# Altium footprint library MyLibrarySum.PcbLib: 208 footprints (part 11 of 13)
Each footprint in its own frame and in the unit in brackets; x right, y up, seen from the top. Pads: shape width x height; smd on the part's side, far side on the other; paste and mask are expansions set on the pad; w line width, h text height; cw(c..) or ccw(c..) is an arc to the next point about the centre after c.
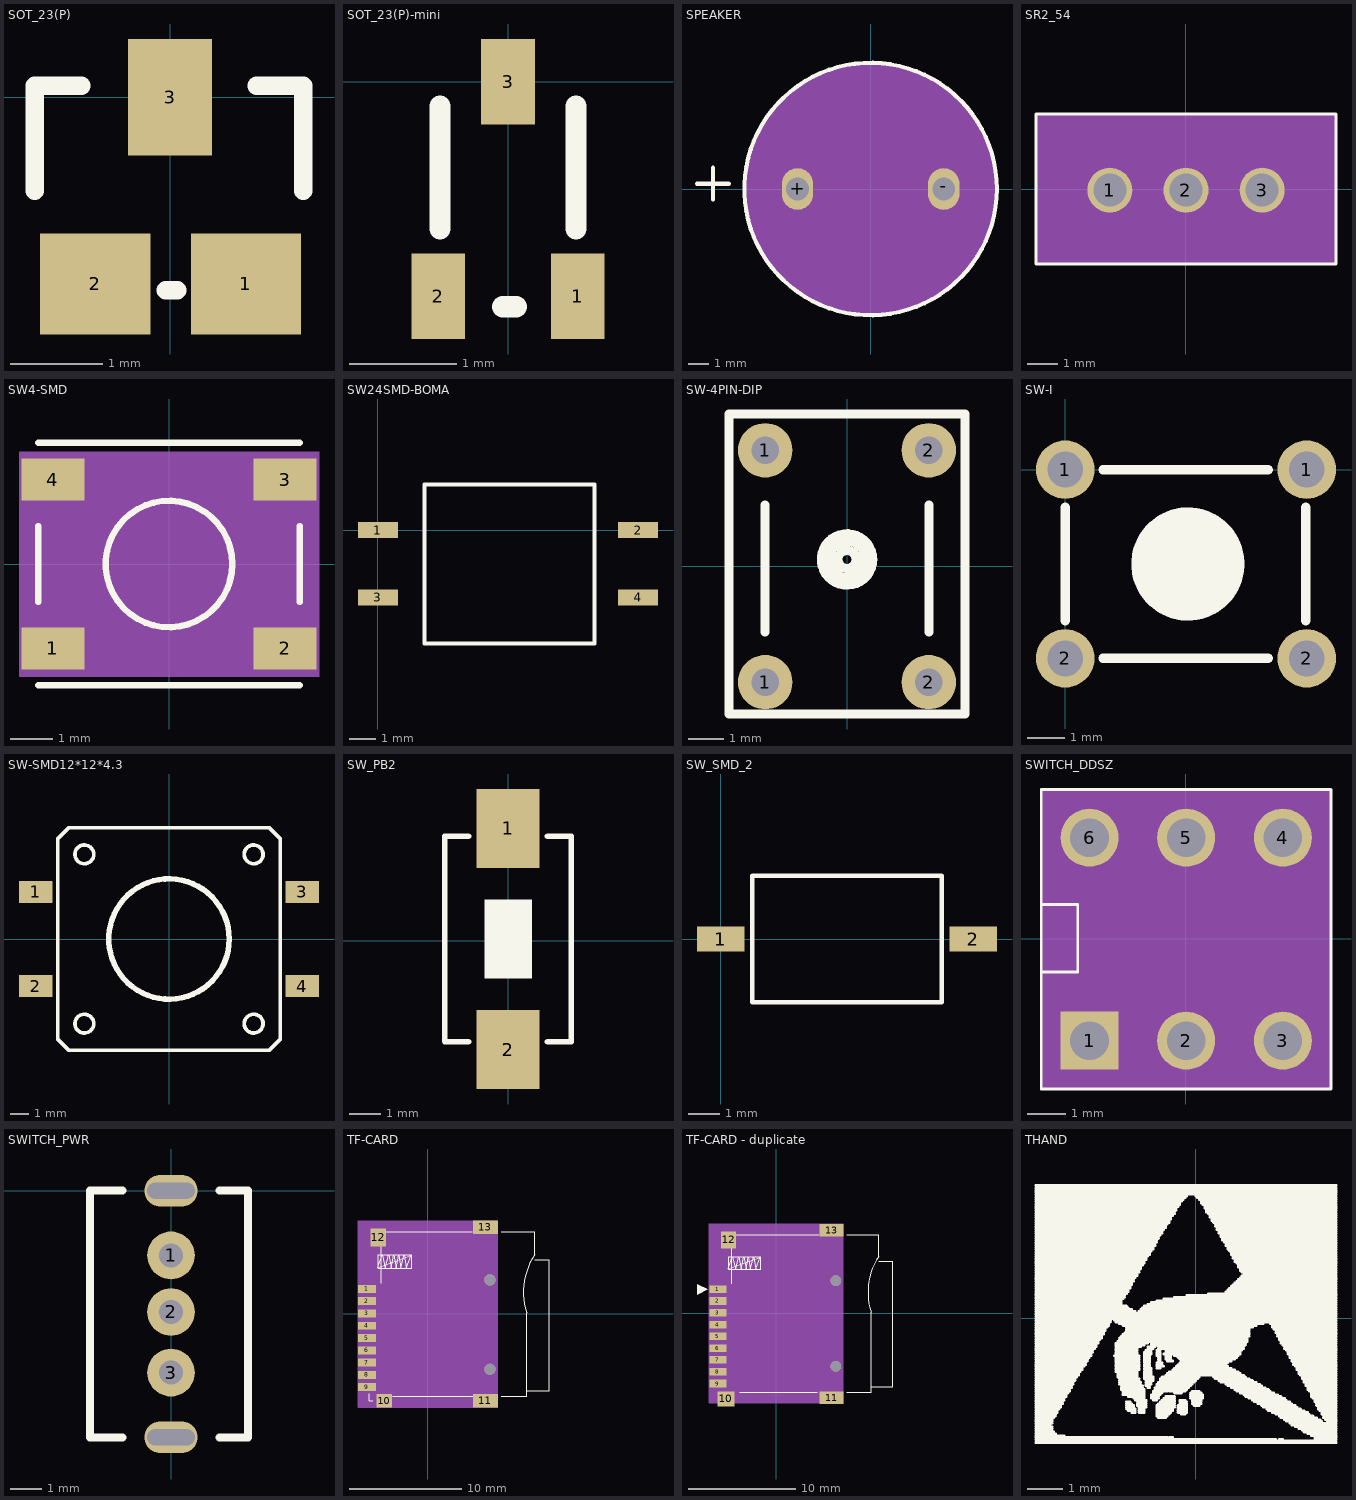
[diagram p10: the footprints below, top view; thin cyan lines are the x and y axes]

## SOT_23(P) [mm]
pads (3):
  rect 1.2x1.1 smd: 1(0.825,-2.032) 2(-0.815,-2.032)
  rect 0.914x1.27 smd: 3(0,0)
Top Overlay:
  lines w0.2: -1.473,-1.016 -1.473,0.127 -0.965,0.127 ; -0.05,-2.1 0.077,-2.1 ; 0.94,0.127 1.448,0.127 1.448,-1.016
3D body: height 1.3, standoff 0, extent -1.5,-2.516 1.5,0.484

## SOT_23(P)-mini [mm]
pads (3):
  rect 0.5x0.8 smd: 1(0.65,-2) 2(-0.65,-2) 3(0,0)
Top Overlay:
  lines w0.2: -0.635,-1.372 -0.635,-0.229 ; -0.05,-2.1 0.077,-2.1 ; 0.635,-1.372 0.635,-0.229

## SPEAKER [mm] "SPEAKER"
pads (2):
  oval 1.5x2 hole 1.1: +(-3.504,0) -(3.504,0)
Top Overlay:
  circle w0.2: c0,0 r6.052
  lines w0.203: -8.322,0.254 -6.798,0.254 ; -7.56,-0.508 -7.56,1.016
Mechanical 11:
  text "+" at -4.266,0 h0.64
  text "-" at 10.258,0 h0.64
Mechanical 12:
  circle w0.025: c0,0 r6.046
  text "PIEZO BUZZER_2" at -2.336,-3.886 h0.89
  text ".Designator" at -2.361,-1.067 h0.89
Mechanical 13:
  pour cut-out: 6.056,0 6.018,0.678 5.904,1.348 5.716,2 5.456,2.627 5.128,3.222 4.735,3.776 4.282,4.282 3.776,4.735 3.222,5.128 2.628,5.456 2,5.716 1.348,5.904 0.678,6.018 0,6.056 -0.678,6.018 -1.347,5.904 -2,5.716 -2.627,5.456 -3.222,5.128 -3.776,4.735 -4.282,4.282 -4.735,3.776 -5.127,3.222 -5.456,2.627 -5.716,2 -5.904,1.348 -6.018,0.678 -6.056,0 -6.018,-0.678 -5.904,-1.348 -5.716,-2 -5.456,-2.627 -5.127,-3.222 -4.735,-3.776 -4.282,-4.282 -3.776,-4.735 -3.222,-5.128 -2.627,-5.456 -2,-5.716 -1.347,-5.904 -0.678,-6.018 0,-6.056 0.678,-6.018 1.348,-5.904 2,-5.716 2.628,-5.456 3.222,-5.128 3.776,-4.735 4.282,-4.282 4.735,-3.776 5.128,-3.222 5.456,-2.627 5.716,-2 5.904,-1.348 6.018,-0.678

## SR2_54 [mm] "SR2_54"
pads (3):
  round 1.5 hole 1.1: 1(-2.54,-0.04) 2(0,-0.04) 3(2.54,-0.04)
Top Overlay:
  lines w0.1: -5,-2.5 5,-2.5 5,2.5 -5,2.5 -5,-2.5
  text ".Designator" at -4.801,5.842 h0.76
Mechanical 11:
  text "3" at 2.54,0.214 h0.64
  text "1" at -3.81,0.468 h0.64
  text "2" at 0,0.214 h0.64
Mechanical 12:
  pour cut-out: -5,-2.5 -5,2.5 5,2.5 5,-2.5
  pour cut-out: -5,-2.5 -5,2.5 5,2.5 5,-2.5
Mechanical 13:
  region: -5,-2.5 -5,2.5 5,2.5 5,-2.5

## SW4-SMD [mm] "SW4-SMD"
pads (4):
  rect 1.5x1 smd: 1(-2.75,-2) 2(2.75,-2) 3(2.75,2) 4(-2.75,2)
Top Overlay:
  circle w0.15: c0,0 r1.5
  lines w0.15: -3.1,-2.873 3.1,-2.873 ; -3.1,-0.9 -3.1,0.9 ; -3.1,2.873 3.1,2.873 ; 3.1,-0.9 3.1,0.9
Mechanical 11:
  text "2" at 2.51,-2 h0.6
  text "1" at -2.99,-2 h0.6
  text "4" at -2.99,2 h0.6
  text "3" at 2.51,2 h0.6
Mechanical 13:
  region: -3.556,2.667 3.556,2.667 3.556,-2.667 -3.556,-2.667
3D body: height 1.5, standoff 0, extent -3.175,-2.625 3.225,2.625

## SW24SMD-BOMA [mm]
pads (4):
  rect 1.5x0.6 smd: 1(0,0) 2(9.8,0) 3(0,-2.54) 4(9.8,-2.54)
Top Overlay:
  lines w0.152: 1.75,-4.28 1.75,1.72 8.15,1.72 8.15,-4.28 1.75,-4.28
3D body: height 4.85, standoff 0, extent 0.126,-4.422 9.526,1.778

## SW-4PIN-DIP [mil]
pads (4):
  round 60 hole 30: 1(-90,-127.5) 1(-90,127.5) 2(90,-127.5) 2(90,127.5)
Top Overlay:
  circle w10: c0,7.5 r10
  circle w10: c0,7.5 r20
  circle w10: c0,7.5 r28.28
  lines w10: -90,-72.5 -90,67.5 ; 90,-72.5 90,67.5 ; -130,-162.5 130,-162.5 130,167.5 -130,167.5 -130,-162.5
3D body: height 190.94, standoff -98.43, extent -117.05,-160 127.05,151.02

## SW-I [mil]
pads (4):
  round 62 hole 38: 1(0,0) 1(255.91,0) 2(0,-200) 2(255.91,-200)
Top Overlay:
  circle w60: c130,-100 r30
  lines w10: -0.03,-160 -0.03,-40 ; 39.97,-200 215,-200 ; 39.97,0 215,0 ; 255,-160 255,-40
3D body: height 334.65, standoff -138, extent -15,-220 278.43,16

## SW-SMD12*12*4.3 [mm]
height 4.3
pads (4):
  rect 1.8x1.2 smd: 1(-7.2,2.54) 2(-7.2,-2.54) 3(7.2,2.54) 4(7.2,-2.54)
Top Overlay:
  circle w0.2: c-4.572,-4.572 r0.508
  circle w0.2: c-4.572,4.572 r0.508
  circle w0.2: c4.572,4.572 r0.508
  circle w0.2: c4.572,-4.572 r0.508
  circle w0.3: c0,0 r3.25
  lines w0.2: -6,-5.43 -6,5.43 -5.43,6 5.43,6 6,5.43 6,-5.43 5.43,-6 -5.43,-6 -6,-5.43
3D body: height 4, standoff 0, extent -6.712,-5.979 6.738,6.021

## SW_PB2 [mm]
pads (2):
  rect 2x2.5 smd: 1(0,3.556) 2(0,-3.444)
Top Overlay:
  region: -0.747,1.309 -0.747,-1.191 0.753,-1.191 0.753,1.309
  lines w0.178: -1.25,-3.194 -2,-3.19 -2,3.306 -1.25,3.306 ; 1.25,-3.194 2,-3.194 2,3.306 1.25,3.306
3D body: height 1.2, standoff 0.8, extent -0.762,-1.143 0.762,1.27
3D body: height 0.8, standoff 0, extent -2.032,-3.175 2.032,3.302

## SW_SMD_2 [mm]
pads (2):
  rect 1.5x0.8 smd: 1(0,0) 2(8,0)
Top Overlay:
  lines w0.152: 1,-2 7,-2 7,2 1,2 1,-2
3D body: height 2.05, standoff 0, extent 0.137,-1.778 7.737,1.822

## SWITCH_DDSZ [mil] "SWITCH_DDSZ"
pads (6):
  rect 60x60 hole 40: 1(-99.65,-105.33)
  round 60 hole 40: 2(0.35,-105.33) 3(100.35,-105.33) 4(100.35,104.67) 5(0.35,104.67) 6(-99.65,104.67)
Top Overlay:
  lines w3: -149.65,104.67 -149.65,154.66 150.35,154.66 150.35,-155.34 -149.65,-155.34 -149.65,104.81 ; -149.22,-34.07 -111.88,-34.07 -111.88,35.42 -148.81,35.42 ; -149.65,104.81 -149.63,104.81
Mechanical 11:
  text "5" at 20.35,104.67 h25
  text "2" at 20.35,-105.33 h25
  text "3" at 120.35,-105.33 h25
  text "6" at -79.65,104.67 h25
  text "4" at 120.35,104.67 h25
  text "1" at -79.65,-105.33 h25
Mechanical 13:
  region: -150.06,-155.08 150.06,-155.08 150.06,155.08 -150.06,155.08

## SWITCH_PWR [mm]
height 5
pads (5):
  round 1.5 hole 0.75: 1(0,-2.032) 2(0,-3.81) 3(0,-5.715)
  oval 1.676x1 hole 0.5 slot 1.5 at 0 deg: ""(0,0) ""(0,-7.747)
Top Overlay:
  lines w0.25: -1.524,-7.747 -2.54,-7.747 -2.54,0 -1.524,0 ; 1.524,-7.747 2.413,-7.747 2.413,0 1.524,0
3D body: height 6.5, standoff -5, extent -1.85,-8.06 1.85,0.44

## TF-CARD [mil] "TF-CARD"
pads (15):
  rect 63x28 smd: 1(-214.56,88.58) 2(-214.56,45.28) 3(-214.56,1.97) 4(-214.56,-41.34) 5(-214.56,-84.64) 6(-214.56,-127.95) 7(-214.56,-171.26) 8(-214.56,-214.57) 9(-214.56,-257.87)
  rect 55x47 smd: 10(-153.14,-305.12)
  rect 87x47 smd: 11(202.76,-305.12) 13(202.76,305.12)
  rect 55x63 smd: 12(-175.19,269.69)
  round 39.37 hole 39.37: " "(218.51,-194.88) " "(218.51,120.08)
Top Overlay:
  lines w2.99: -206.69,-281.1 -206.69,-305.12 -194.88,-305.12 ; -163.38,108.27 -163.38,289.37 156.69,289.37 ; -124.01,-289.37 159.45,-289.37 ; 257.88,-289.37 348.43,-289.37 348.43,3.94 cw(c573.74,77.57) 375.99,208.27 375.99,289.37 257.88,289.37 ; 350.01,-269.68 427.17,-269.68 427.17,190.95 376.38,190.95 ; -175.98,163.39 -161.41,208.27 -149.99,161.81 -138.18,208.27 -128.34,161.81 -119.29,208.27 -111.42,161.81 -102.75,208.27 -95.27,161.81 -82.28,208.27 -75.98,161.81 -58.27,206.69 -175.98,163.39 ; -175.19,161.42 -57.09,161.42 -57.09,208.66 -175.19,208.66 -175.19,161.42
Mechanical 11:
  text "11" at 222.76,-305.12 h25
  text "12" at -155.19,269.69 h25
  text "13" at 222.76,305.12 h25
  text "9" at -204.56,-257.87 h25
  text "10" at -133.14,-305.12 h25
  text "6" at -204.56,-127.95 h25
  text "4" at -204.56,-41.34 h25
  text "2" at -204.56,45.28 h25
  text "3" at -204.56,1.97 h25
  text "1" at -204.56,88.58 h25
  text "5" at -204.56,-84.64 h25
  text "7" at -204.56,-171.26 h25
  text "8" at -204.56,-214.57 h25
Mechanical 12:
  lines w1: -246.06,-328.74 -246.06,328.74 246.06,328.74 246.06,-328.74 -246.06,-328.74
Mechanical 13:
  region: -246.06,-328.74 246.06,-328.74 246.06,328.74 -246.06,328.74

## TF-CARD - duplicate [mil] "TF-CARD"
pads (15):
  rect 63x28 smd: 1(-214.56,88.58) 2(-214.56,45.28) 3(-214.56,1.97) 4(-214.56,-41.34) 5(-214.56,-84.64) 6(-214.56,-127.95) 7(-214.56,-171.26) 8(-214.56,-214.57) 9(-214.56,-257.87)
  rect 63x55 smd: 10(-185.19,-314.12)
  rect 87x47 smd: 11(202.75,-310.12) 13(202.75,305.12)
  rect 55x63 smd: 12(-175.19,269.69)
  round 39.37 / inner round 60 / far side round 39.37 hole 39.37: " "(218.5,-194.88) " "(218.5,120.08)
Top Overlay:
  pour cut-out: -291.5,107.6 -291.5,67.6 -251.5,87.6
  lines w3: -163.38,108.27 -163.38,289.37 156.69,289.37 ; -134.01,-289.37 149.44,-289.37 ; 257.88,-289.37 348.43,-289.37 348.43,3.94 cw(c573.74,77.57) 375.98,208.27 375.99,289.37 257.88,289.37 ; 350,-269.68 427.17,-269.68 427.17,190.95 376.38,190.95 ; -175.99,163.39 -58.27,206.69 -75.98,161.81 -82.28,208.27 -95.28,161.81 -102.75,208.27 -111.42,161.81 -119.3,208.27 -128.34,161.81 -138.19,208.27 -150,161.81 -161.41,208.27 -175.99,163.39 ; -175.19,161.42 -175.19,208.66 -57.09,208.66 -57.09,161.42 -175.19,161.42
Mechanical 9:
  text "8" at -204.56,-214.57 h25
  text "7" at -204.56,-171.26 h25
  text "5" at -204.56,-84.64 h25
  text "1" at -204.56,88.58 h25
  text "3" at -204.56,1.97 h25
  text "2" at -204.56,45.28 h25
  text "4" at -204.56,-41.34 h25
  text "10" at -165.19,-314.12 h25
  text "11" at 222.75,-310.12 h25
  text "13" at 222.75,305.12 h25
  text "6" at -204.56,-127.95 h25
  text "12" at -155.19,269.69 h25
  text "9" at -204.56,-257.87 h25
Mechanical 10:
  region: -246.06,-328.74 246.06,-328.74 246.06,328.74 -246.06,328.74
Mechanical 11:
  lines w1: -246.06,-328.74 246.06,-328.74 246.06,328.74 -246.06,328.74 -246.06,-328.74

## THAND [mm]
Top Overlay:
  drawing of 472 lines, arcs and shapes, not listed